# Altium footprint library 电容.PcbLib: 172 footprints (part 4 of 11)
Each footprint in its own frame and in the unit in brackets; x right, y up, seen from the top. Pads: shape width x height; smd on the part's side, far side on the other; paste and mask are expansions set on the pad; w line width, h text height; cw(c..) or ccw(c..) is an arc to the next point about the centre after c.
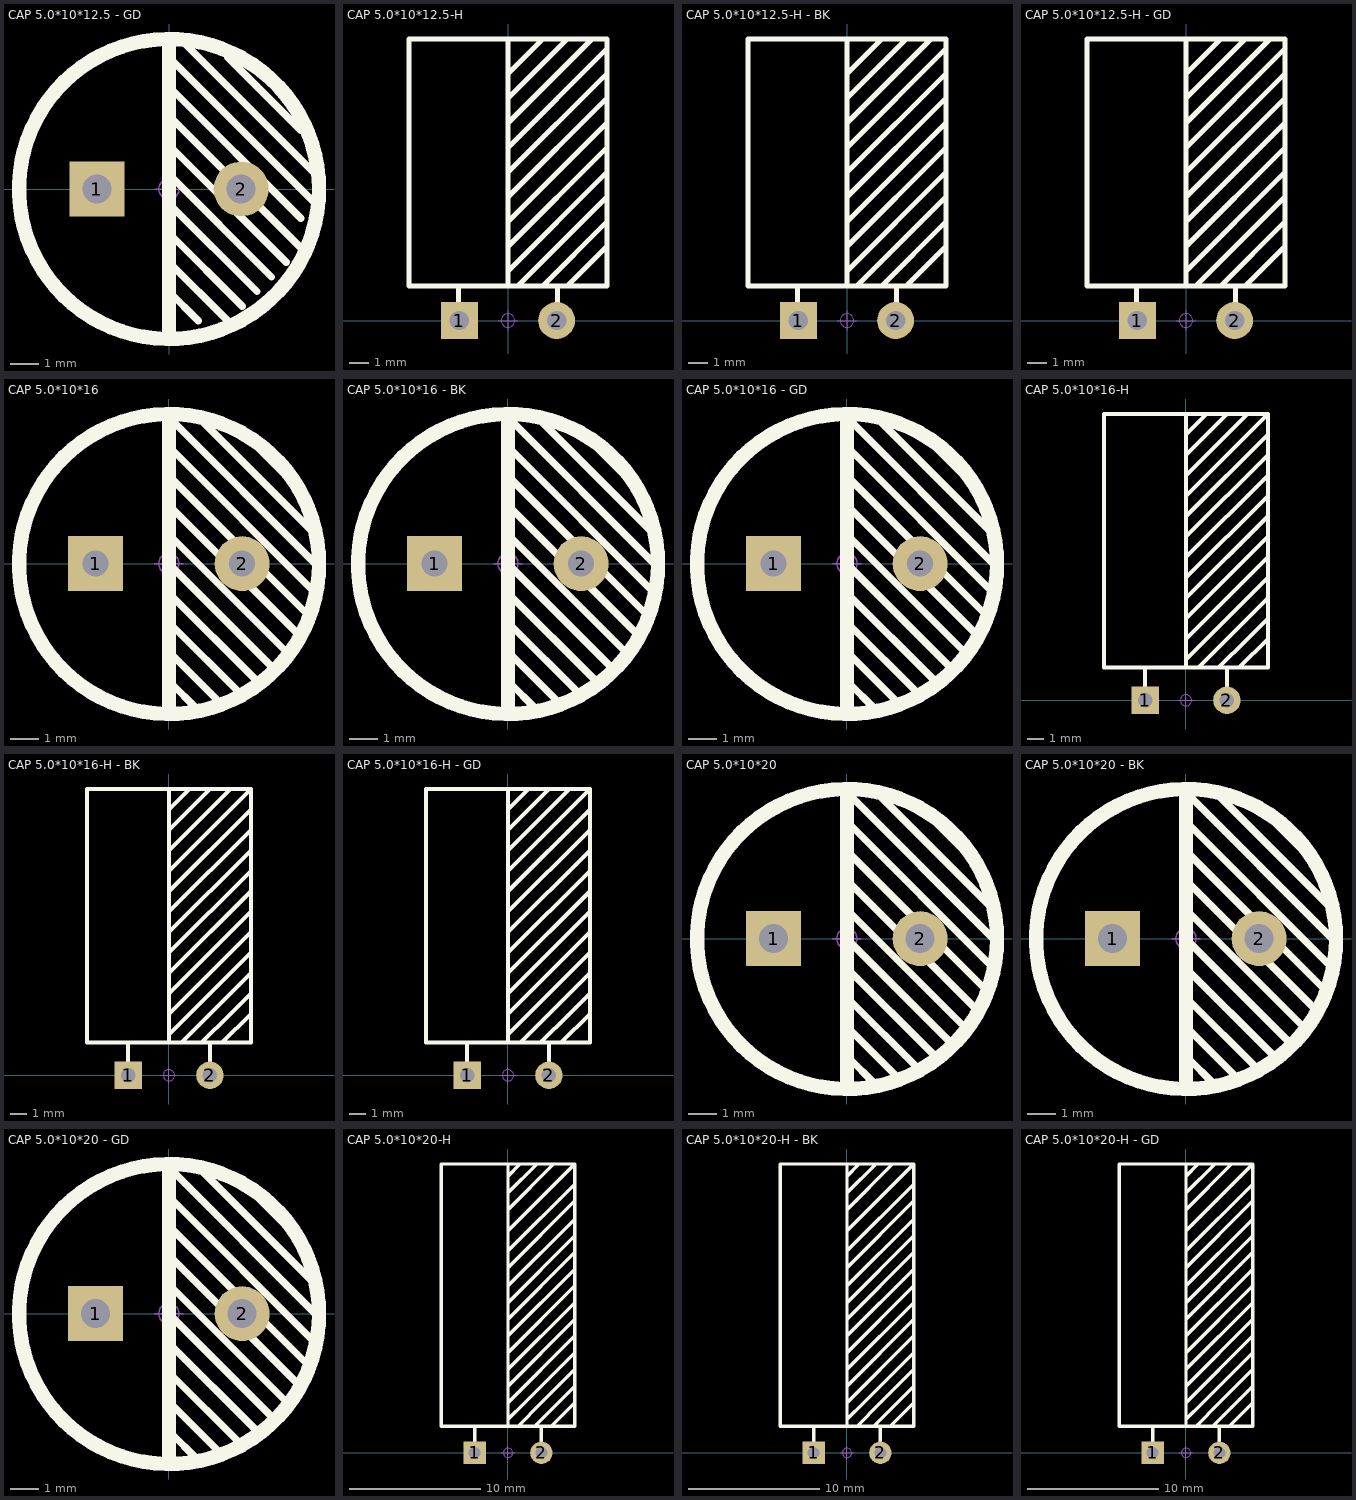
[diagram p3: the footprints below, top view; thin cyan lines are the x and y axes]

## CAP 5.0*10*12.5 - GD [mm] "脚距5mm直径10mm高度12.5mm"
pads (2):
  rect 1.9x1.9 hole 1: 1(-2.5,0)
  round 1.9 hole 1: 2(2.5,0)
Top Overlay:
  circle w0.5: c0,0 r5.2
  lines w0.254: 0,-3.556 1.016,-4.572 ; 0,-2.54 2.032,-4.572 ; 0,-1.524 2.54,-4.064 ; 0,-1.016 0,-0.508 3.048,-3.556 ; 0,0.508 3.556,-3.048 ; 0,1.524 4.064,-2.54 ; 0,2.54 4.572,-2.032 ; 0,3.556 4.572,-1.016 ; 0,4.572 5.08,-0.508 ; 0.508,5.08 5.08,0.508 ; 2.032,4.572 4.572,2.032
  lines w0.5: 0,-5 0,5
Mechanical 15:
  circle w0.05: c0,0 r0.35
  lines w0.05: -0.5,0 0.5,0 ; 0,-0.5 0,0.5
3D body "CAP 5X10X12.5.STEP": height 12.54, standoff -3.37, extent -5,-4.999 5.01,4.999

## CAP 5.0*10*12.5-H [mm] "脚距5mm直径10mm高度12.5mm"
pads (2):
  rect 1.9x1.9 hole 1: 1(-2.5,0)
  round 1.9 hole 1: 2(2.5,0)
Top Overlay:
  lines w0.254: -2.54,0.762 -2.54,1.778 ; 0,1.778 0,14.41 ; 0,2.54 5.08,7.62 ; 0,3.81 5.08,8.89 ; 0,5.08 5.08,10.16 ; 0,6.35 5.08,11.43 ; 0,7.62 5.08,12.7 ; 0,8.89 5.08,13.97 ; 0,10.16 4.318,14.478 ; 0,11.43 3.048,14.478 ; 0,12.7 1.778,14.478 ; 0.508,1.778 5.08,6.35 ; 1.778,1.778 5.08,5.08 ; 2.54,0.762 2.54,1.778 ; 3.048,1.778 5.08,3.81 ; -5.08,1.778 -5.08,14.478 5.08,14.478 5.08,1.778 -5.08,1.778
Mechanical 15:
  circle w0.05: c0,0 r0.35
  lines w0.05: -0.5,0 0.5,0 ; 0,-0.5 0,0.5
3D body "CAP 5X10X12.5-H.STEP": height 10.03, standoff -3.47, extent -5,-0.3 5.01,14.41

## CAP 5.0*10*12.5-H - BK [mm] "脚距5mm直径10mm高度12.5mm"
pads (2):
  rect 1.9x1.9 hole 1: 1(-2.5,0)
  round 1.9 hole 1: 2(2.5,0)
Top Overlay:
  lines w0.254: -2.54,0.762 -2.54,1.778 ; 0,1.778 0,14.41 ; 0,2.54 5.08,7.62 ; 0,3.81 5.08,8.89 ; 0,5.08 5.08,10.16 ; 0,6.35 5.08,11.43 ; 0,7.62 5.08,12.7 ; 0,8.89 5.08,13.97 ; 0,10.16 4.318,14.478 ; 0,11.43 3.048,14.478 ; 0,12.7 1.778,14.478 ; 0.508,1.778 5.08,6.35 ; 1.778,1.778 5.08,5.08 ; 2.54,0.762 2.54,1.778 ; 3.048,1.778 5.08,3.81 ; -5.08,1.778 -5.08,14.478 5.08,14.478 5.08,1.778 -5.08,1.778
Mechanical 15:
  circle w0.05: c0,0 r0.35
  lines w0.05: -0.5,0 0.5,0 ; 0,-0.5 0,0.5
3D body "CAP 5X10X12.5-H.STEP": height 10.03, standoff -3.48, extent -5,-0.3 5.01,14.41

## CAP 5.0*10*12.5-H - GD [mm] "脚距5mm直径10mm高度12.5mm"
pads (2):
  rect 1.9x1.9 hole 1: 1(-2.5,0)
  round 1.9 hole 1: 2(2.5,0)
Top Overlay:
  lines w0.254: -2.54,0.762 -2.54,1.778 ; 0,1.778 0,14.478 ; 0,2.54 5.08,7.62 ; 0,3.81 5.08,8.89 ; 0,5.08 5.08,10.16 ; 0,6.35 5.08,11.43 ; 0,7.62 5.08,12.7 ; 0,8.89 5.08,13.97 ; 0,10.16 4.318,14.478 ; 0,11.43 3.048,14.478 ; 0,12.7 1.778,14.478 ; 0.508,1.778 5.08,6.35 ; 1.778,1.778 5.08,5.08 ; 2.54,0.762 2.54,1.778 ; 3.048,1.778 5.08,3.81 ; -5.08,1.778 5.08,1.778 5.08,14.478 -5.08,14.478 -5.08,1.778
Mechanical 15:
  circle w0.05: c0,0 r0.35
  lines w0.05: -0.5,0 0.5,0 ; 0,-0.5 0,0.5
3D body "CAP 5X10X12.5-H.STEP": height 10.03, standoff -3.48, extent -5,-0.3 5.01,14.41

## CAP 5.0*10*16 [mm] "脚距5mm直径10mm高度16mm"
pads (2):
  rect 1.9x1.9 hole 0.9: 1(-2.54,0)
  round 1.9 hole 0.9: 2(2.54,0)
Top Overlay:
  circle w0.5: c0.006,-0.013 r5.2
  lines w0.254: 0,-1.016 3.048,-4.064 ; 0,0 3.556,-3.556 ; 0,2.032 4.572,-2.54 ; 0,3.048 4.826,-1.778 4.953,-1.778 ; 0.006,-5.082 0.006,-5.075 ; 0.006,-4.064 0.006,-4.07 1.016,-5.08 ; 0.006,-3.043 0.006,-3.05 0.006,-3.054 1.714,-4.763 ; 0.006,-2.032 0.006,-2.038 2.54,-4.572 ; 0.006,1.016 0.006,1.01 4.064,-3.048 ; 0.006,4.064 0.006,4.058 5.08,-1.016 ; 0.006,5.187 0.006,5.074 5.08,0 ; 1.016,5.08 5.08,1.016 ; 2.54,4.572 4.572,2.54
  lines w0.5: 0.006,-5.197 0.006,5.072
Mechanical 15:
  circle w0.05: c0,0 r0.35
  lines w0.05: -0.5,0 0.5,0 ; 0,-0.5 0,0.5
3D body "CAP 5X10X16.STEP": height 16.04, standoff -3.37, extent -5,-5 5.01,5

## CAP 5.0*10*16 - BK [mm] "脚距5mm直径10mm高度16mm"
pads (2):
  rect 1.9x1.9 hole 0.9: 1(-2.54,0)
  round 1.9 hole 0.9: 2(2.54,0)
Top Overlay:
  circle w0.5: c0.006,-0.013 r5.2
  lines w0.254: 0,-1.016 3.048,-4.064 ; 0,0 3.556,-3.556 ; 0,2.032 4.572,-2.54 ; 0,3.048 4.826,-1.778 4.953,-1.778 ; 0.006,-5.082 0.006,-5.075 ; 0.006,-4.064 0.006,-4.07 1.016,-5.08 ; 0.006,-3.043 0.006,-3.05 0.006,-3.054 1.714,-4.763 ; 0.006,-2.032 0.006,-2.038 2.54,-4.572 ; 0.006,1.016 0.006,1.01 4.064,-3.048 ; 0.006,4.064 0.006,4.058 5.08,-1.016 ; 0.006,5.187 0.006,5.074 5.08,0 ; 1.016,5.08 5.08,1.016 ; 2.54,4.572 4.572,2.54
  lines w0.5: 0.006,-5.197 0.006,5.072
Mechanical 15:
  circle w0.05: c0.006,0 r0.35
  lines w0.05: -0.494,0 0.506,0 ; 0.006,-0.5 0.006,0.5
3D body "CAP 5X10X16.STEP": height 16.04, standoff -3.37, extent -5,-5 5.01,5

## CAP 5.0*10*16 - GD [mm] "脚距5mm直径10mm高度16mm"
pads (2):
  rect 1.9x1.9 hole 0.9: 1(-2.54,0)
  round 1.9 hole 0.9: 2(2.54,0)
Top Overlay:
  circle w0.5: c0.006,-0.013 r5.2
  lines w0.254: 0,-1.016 3.048,-4.064 ; 0,0 3.556,-3.556 ; 0,2.032 4.572,-2.54 ; 0,3.048 4.826,-1.778 4.953,-1.778 ; 0.006,-5.082 0.006,-5.075 ; 0.006,-4.064 0.006,-4.07 1.016,-5.08 ; 0.006,-3.043 0.006,-3.05 0.006,-3.054 1.714,-4.763 ; 0.006,-2.032 0.006,-2.038 2.54,-4.572 ; 0.006,1.016 0.006,1.01 4.064,-3.048 ; 0.006,4.064 0.006,4.058 5.08,-1.016 ; 0.006,5.187 0.006,5.074 5.08,0 ; 1.016,5.08 5.08,1.016 ; 2.54,4.572 4.572,2.54
  lines w0.5: 0.006,-5.197 0.006,5.072
Mechanical 15:
  circle w0.05: c0.006,0 r0.35
  lines w0.05: -0.494,0 0.506,0 ; 0.006,-0.5 0.006,0.5
3D body "CAP 5X10X16.STEP": height 16.04, standoff -3.37, extent -5,-5 5.01,5

## CAP 5.0*10*16-H [mm] "脚距5mm直径10mm高度16mm"
pads (2):
  rect 1.7x1.7 hole 0.9: 1(-2.54,0)
  round 1.7 hole 0.9: 2(2.54,0)
Top Overlay:
  lines w0.254: -2.54,0.762 -2.54,1.778 -2.54,2.032 ; 0,2.032 0,2.54 ; 0,4.064 0,2.54 ; 0,5.08 5.08,10.16 ; 0,6.35 5.08,11.43 ; 0,7.62 5.08,12.7 ; 0,8.89 5.08,13.97 ; 0,10.16 5.08,15.24 ; 0,11.43 5.08,16.51 ; 0,12.7 5.08,17.78 ; 0,13.97 3.81,17.78 ; 0,15.24 2.54,17.78 ; 0,16.51 1.27,17.78 ; 0,17.78 0,3.81 5.08,8.89 ; 0.762,2.032 2.54,3.81 5.08,6.35 ; 2.032,2.032 3.81,3.81 5.08,5.08 ; 2.54,0.762 2.54,1.778 2.54,2.032 ; 3.302,2.032 5.08,3.81 ; 5.08,7.62 1.27,3.81 0,2.54 ; 5.08,17.78 -5.08,17.78 -5.08,2.032 5.08,2.032 5.08,17.78
Mechanical 15:
  circle w0.05: c0,0 r0.35
  lines w0.05: -0.5,0 0.5,0 ; 0,-0.5 0,0.5
3D body "CAP 5X10X16-H.STEP": height 10.03, standoff -3.47, extent -5.04,-0.3 4.97,17.91

## CAP 5.0*10*16-H - BK [mm] "脚距5mm直径10mm高度16mm"
pads (2):
  rect 1.7x1.7 hole 0.9: 1(-2.54,0)
  round 1.7 hole 0.9: 2(2.54,0)
Top Overlay:
  lines w0.254: -2.54,0.762 -2.54,1.778 -2.54,2.032 ; 0,2.032 0,2.54 ; 0,4.064 0,2.54 ; 0,5.08 5.08,10.16 ; 0,6.35 5.08,11.43 ; 0,7.62 5.08,12.7 ; 0,8.89 5.08,13.97 ; 0,10.16 5.08,15.24 ; 0,11.43 5.08,16.51 ; 0,12.7 5.08,17.78 ; 0,13.97 3.81,17.78 ; 0,15.24 2.54,17.78 ; 0,16.51 1.27,17.78 ; 0,17.78 0,3.81 5.08,8.89 ; 0.762,2.032 2.54,3.81 5.08,6.35 ; 2.032,2.032 3.81,3.81 5.08,5.08 ; 2.54,0.762 2.54,1.778 2.54,2.032 ; 3.302,2.032 5.08,3.81 ; 5.08,7.62 1.27,3.81 0,2.54 ; 5.08,17.78 -5.08,17.78 -5.08,2.032 5.08,2.032 5.08,17.78
Mechanical 15:
  circle w0.05: c0,0 r0.35
  lines w0.05: -0.5,0 0.5,0 ; 0,-0.5 0,0.5
3D body "CAP 5X10X16-H.STEP": height 10.03, standoff -3.48, extent -5.04,-0.3 4.97,17.91

## CAP 5.0*10*16-H - GD [mm] "脚距5mm直径10mm高度16mm"
pads (2):
  rect 1.7x1.7 hole 0.9: 1(-2.54,0)
  round 1.7 hole 0.9: 2(2.54,0)
Top Overlay:
  lines w0.254: -2.54,0.762 -2.54,1.778 -2.54,2.032 ; 0,2.032 0,2.54 ; 0,4.064 0,2.54 ; 0,5.08 5.08,10.16 ; 0,6.35 5.08,11.43 ; 0,7.62 5.08,12.7 ; 0,8.89 5.08,13.97 ; 0,10.16 5.08,15.24 ; 0,11.43 5.08,16.51 ; 0,12.7 5.08,17.78 ; 0,13.97 3.81,17.78 ; 0,15.24 2.54,17.78 ; 0,16.51 1.27,17.78 ; 0,17.78 0,3.81 5.08,8.89 ; 0.762,2.032 2.54,3.81 5.08,6.35 ; 2.032,2.032 3.81,3.81 5.08,5.08 ; 2.54,0.762 2.54,1.778 2.54,2.032 ; 3.302,2.032 5.08,3.81 ; 5.08,7.62 1.27,3.81 0,2.54 ; 5.08,17.78 -5.08,17.78 -5.08,2.032 5.08,2.032 5.08,17.78
Mechanical 15:
  circle w0.05: c0,0 r0.35
  lines w0.05: -0.5,0 0.5,0 ; 0,-0.5 0,0.5
3D body "CAP 5X10X16-H.STEP": height 10.03, standoff -3.48, extent -5.04,-0.3 4.97,17.91

## CAP 5.0*10*20 [mm] "脚距5mm直径10mm高度20mm"
pads (2):
  rect 1.9x1.9 hole 1: 1(-2.54,0)
  round 1.9 hole 1: 2(2.54,0)
Top Overlay:
  circle w0.5: c0.006,-0.013 r5.2
  lines w0.254: 0,-1.016 3.048,-4.064 ; 0,0 3.556,-3.556 ; 0,2.032 4.572,-2.54 ; 0,3.048 4.826,-1.778 4.953,-1.778 ; 0.006,-5.082 0.006,-5.075 ; 0.006,-4.064 0.006,-4.07 1.016,-5.08 ; 0.006,-3.043 0.006,-3.05 0.006,-3.054 1.714,-4.763 ; 0.006,-2.032 0.006,-2.038 2.54,-4.572 ; 0.006,1.016 0.006,1.01 4.064,-3.048 ; 0.006,4.064 0.006,4.058 5.08,-1.016 ; 0.006,5.187 0.006,5.074 5.08,0 ; 1.016,5.08 5.08,1.016 ; 2.54,4.572 4.572,2.54
  lines w0.5: 0.006,-5.197 0.006,5.072
Mechanical 15:
  circle w0.05: c0,0 r0.35
  lines w0.05: -0.5,0 0.5,0 ; 0,-0.5 0,0.5
3D body "CAP 5X10X20.STEP": height 20.03, standoff -3.38, extent -5,-4.998 5.01,4.998

## CAP 5.0*10*20 - BK [mm] "脚距5mm直径10mm高度20mm"
pads (2):
  rect 1.9x1.9 hole 1: 1(-2.54,0)
  round 1.9 hole 1: 2(2.54,0)
Top Overlay:
  circle w0.5: c0.006,-0.013 r5.2
  lines w0.254: 0,-1.016 3.048,-4.064 ; 0,0 3.556,-3.556 ; 0,2.032 4.572,-2.54 ; 0,3.048 4.826,-1.778 4.953,-1.778 ; 0.006,-5.082 0.006,-5.075 ; 0.006,-4.064 0.006,-4.07 1.016,-5.08 ; 0.006,-3.043 0.006,-3.05 0.006,-3.054 1.714,-4.763 ; 0.006,-2.032 0.006,-2.038 2.54,-4.572 ; 0.006,1.016 0.006,1.01 4.064,-3.048 ; 0.006,4.064 0.006,4.058 5.08,-1.016 ; 0.006,5.187 0.006,5.074 5.08,0 ; 1.016,5.08 5.08,1.016 ; 2.54,4.572 4.572,2.54
  lines w0.5: 0.006,-5.197 0.006,5.072
Mechanical 15:
  circle w0.05: c0.006,0 r0.35
  lines w0.05: -0.494,0 0.506,0 ; 0.006,-0.5 0.006,0.5
3D body "CAP 5X10X20.STEP": height 20.04, standoff -3.37, extent -5,-4.998 5.01,4.998

## CAP 5.0*10*20 - GD [mm] "脚距5mm直径10mm高度20mm"
pads (2):
  rect 1.9x1.9 hole 1: 1(-2.54,0)
  round 1.9 hole 1: 2(2.54,0)
Top Overlay:
  circle w0.5: c0.006,-0.013 r5.2
  lines w0.254: 0,-1.016 3.048,-4.064 ; 0,0 3.556,-3.556 ; 0,2.032 4.572,-2.54 ; 0,3.048 4.826,-1.778 4.953,-1.778 ; 0.006,-5.082 0.006,-5.075 ; 0.006,-4.064 0.006,-4.07 1.016,-5.08 ; 0.006,-3.043 0.006,-3.05 0.006,-3.054 1.714,-4.763 ; 0.006,-2.032 0.006,-2.038 2.54,-4.572 ; 0.006,1.016 0.006,1.01 4.064,-3.048 ; 0.006,4.064 0.006,4.058 5.08,-1.016 ; 0.006,5.187 0.006,5.074 5.08,0 ; 1.016,5.08 5.08,1.016 ; 2.54,4.572 4.572,2.54
  lines w0.5: 0.006,-5.197 0.006,5.072
Mechanical 15:
  circle w0.05: c0,0 r0.35
  lines w0.05: -0.5,0 0.5,0 ; 0,-0.5 0,0.5
3D body "CAP 5X10X20.STEP": height 20.04, standoff -3.37, extent -5,-4.998 5.01,4.998

## CAP 5.0*10*20-H [mm] "脚距5mm直径10mm高度20mm"
pads (2):
  rect 1.7x1.7 hole 0.9: 1(-2.54,0)
  round 1.7 hole 0.9: 2(2.54,0)
Top Overlay:
  lines w0.254: -2.54,0.762 -2.54,1.778 -2.54,2.032 ; 0,2.032 0,2.54 ; 0,4.064 0,2.54 ; 0,5.08 5.08,10.16 ; 0,6.35 5.08,11.43 ; 0,7.62 5.08,12.7 ; 0,8.89 5.08,13.97 ; 0,10.16 5.08,15.24 ; 0,11.43 5.08,16.51 ; 0,12.7 5.08,17.78 ; 0,14.097 5.08,19.177 ; 0,15.367 5.08,20.447 ; 0,16.891 5.08,21.971 ; 0,18.5 3.45,21.95 ; 0,19.77 2.18,21.95 ; 0,21.04 0.91,21.95 ; 0,21.971 0,3.81 5.08,8.89 ; 0.762,2.032 2.54,3.81 5.08,6.35 ; 2.032,2.032 3.81,3.81 5.08,5.08 ; 2.54,0.762 2.54,1.778 2.54,2.032 ; 3.302,2.032 5.08,3.81 ; 5.08,7.62 1.27,3.81 0,2.54 ; 5.08,21.971 5.08,2.032 -5.08,2.032 -5.08,21.971 5.08,21.971
Mechanical 15:
  circle w0.05: c0,0 r0.35
  lines w0.05: -0.5,0 0.5,0 ; 0,-0.5 0,0.5
3D body "CAP 5X10X20-H.STEP": height 10.03, standoff -3.47, extent -5.04,-0.3 4.97,21.91

## CAP 5.0*10*20-H - BK [mm] "脚距5mm直径10mm高度20mm"
pads (2):
  rect 1.7x1.7 hole 0.9: 1(-2.54,0)
  round 1.7 hole 0.9: 2(2.54,0)
Top Overlay:
  lines w0.254: -2.54,0.762 -2.54,1.778 -2.54,2.032 ; 0,2.032 0,2.54 ; 0,4.064 0,2.54 ; 0,5.08 5.08,10.16 ; 0,6.35 5.08,11.43 ; 0,7.62 5.08,12.7 ; 0,8.89 5.08,13.97 ; 0,10.16 5.08,15.24 ; 0,11.43 5.08,16.51 ; 0,12.7 5.08,17.78 ; 0,14.097 5.08,19.177 ; 0,15.367 5.08,20.447 ; 0,16.891 5.08,21.971 ; 0,18.5 3.45,21.95 ; 0,19.77 2.18,21.95 ; 0,21.04 0.91,21.95 ; 0,21.971 0,3.81 5.08,8.89 ; 0.762,2.032 2.54,3.81 5.08,6.35 ; 2.032,2.032 3.81,3.81 5.08,5.08 ; 2.54,0.762 2.54,1.778 2.54,2.032 ; 3.302,2.032 5.08,3.81 ; 5.08,7.62 1.27,3.81 0,2.54 ; 5.08,21.971 5.08,2.032 -5.08,2.032 -5.08,21.971 5.08,21.971
Mechanical 15:
  circle w0.05: c0,0 r0.35
  lines w0.05: -0.5,0 0.5,0 ; 0,-0.5 0,0.5
3D body "CAP 5X10X20-H.STEP": height 10.03, standoff -3.48, extent -5.04,-0.3 4.97,21.91

## CAP 5.0*10*20-H - GD [mm] "脚距5mm直径10mm高度20mm"
pads (2):
  rect 1.7x1.7 hole 0.9: 1(-2.54,0)
  round 1.7 hole 0.9: 2(2.54,0)
Top Overlay:
  lines w0.254: -2.54,0.762 -2.54,1.778 -2.54,2.032 ; 0,2.032 0,2.54 ; 0,4.064 0,2.54 ; 0,5.08 5.08,10.16 ; 0,6.35 5.08,11.43 ; 0,7.62 5.08,12.7 ; 0,8.89 5.08,13.97 ; 0,10.16 5.08,15.24 ; 0,11.43 5.08,16.51 ; 0,12.7 5.08,17.78 ; 0,14.097 5.08,19.177 ; 0,15.367 5.08,20.447 ; 0,16.891 5.08,21.971 ; 0,18.5 3.45,21.95 ; 0,19.77 2.18,21.95 ; 0,21.04 0.91,21.95 ; 0,21.971 0,3.81 5.08,8.89 ; 0.762,2.032 2.54,3.81 5.08,6.35 ; 2.032,2.032 3.81,3.81 5.08,5.08 ; 2.54,0.762 2.54,1.778 2.54,2.032 ; 3.302,2.032 5.08,3.81 ; 5.08,7.62 1.27,3.81 0,2.54 ; 5.08,21.971 5.08,2.032 -5.08,2.032 -5.08,21.971 5.08,21.971
Mechanical 15:
  circle w0.05: c0,0 r0.35
  lines w0.05: -0.5,0 0.5,0 ; 0,-0.5 0,0.5
3D body "CAP 5X10X20-H.STEP": height 10.03, standoff -3.48, extent -5.04,-0.3 4.97,21.91